# Altium footprint library My Footprint.PcbLib: 268 footprints (part 16 of 17)
Each footprint in its own frame and in the unit in brackets; x right, y up, seen from the top. Pads: shape width x height; smd on the part's side, far side on the other; paste and mask are expansions set on the pad; w line width, h text height; cw(c..) or ccw(c..) is an arc to the next point about the centre after c.
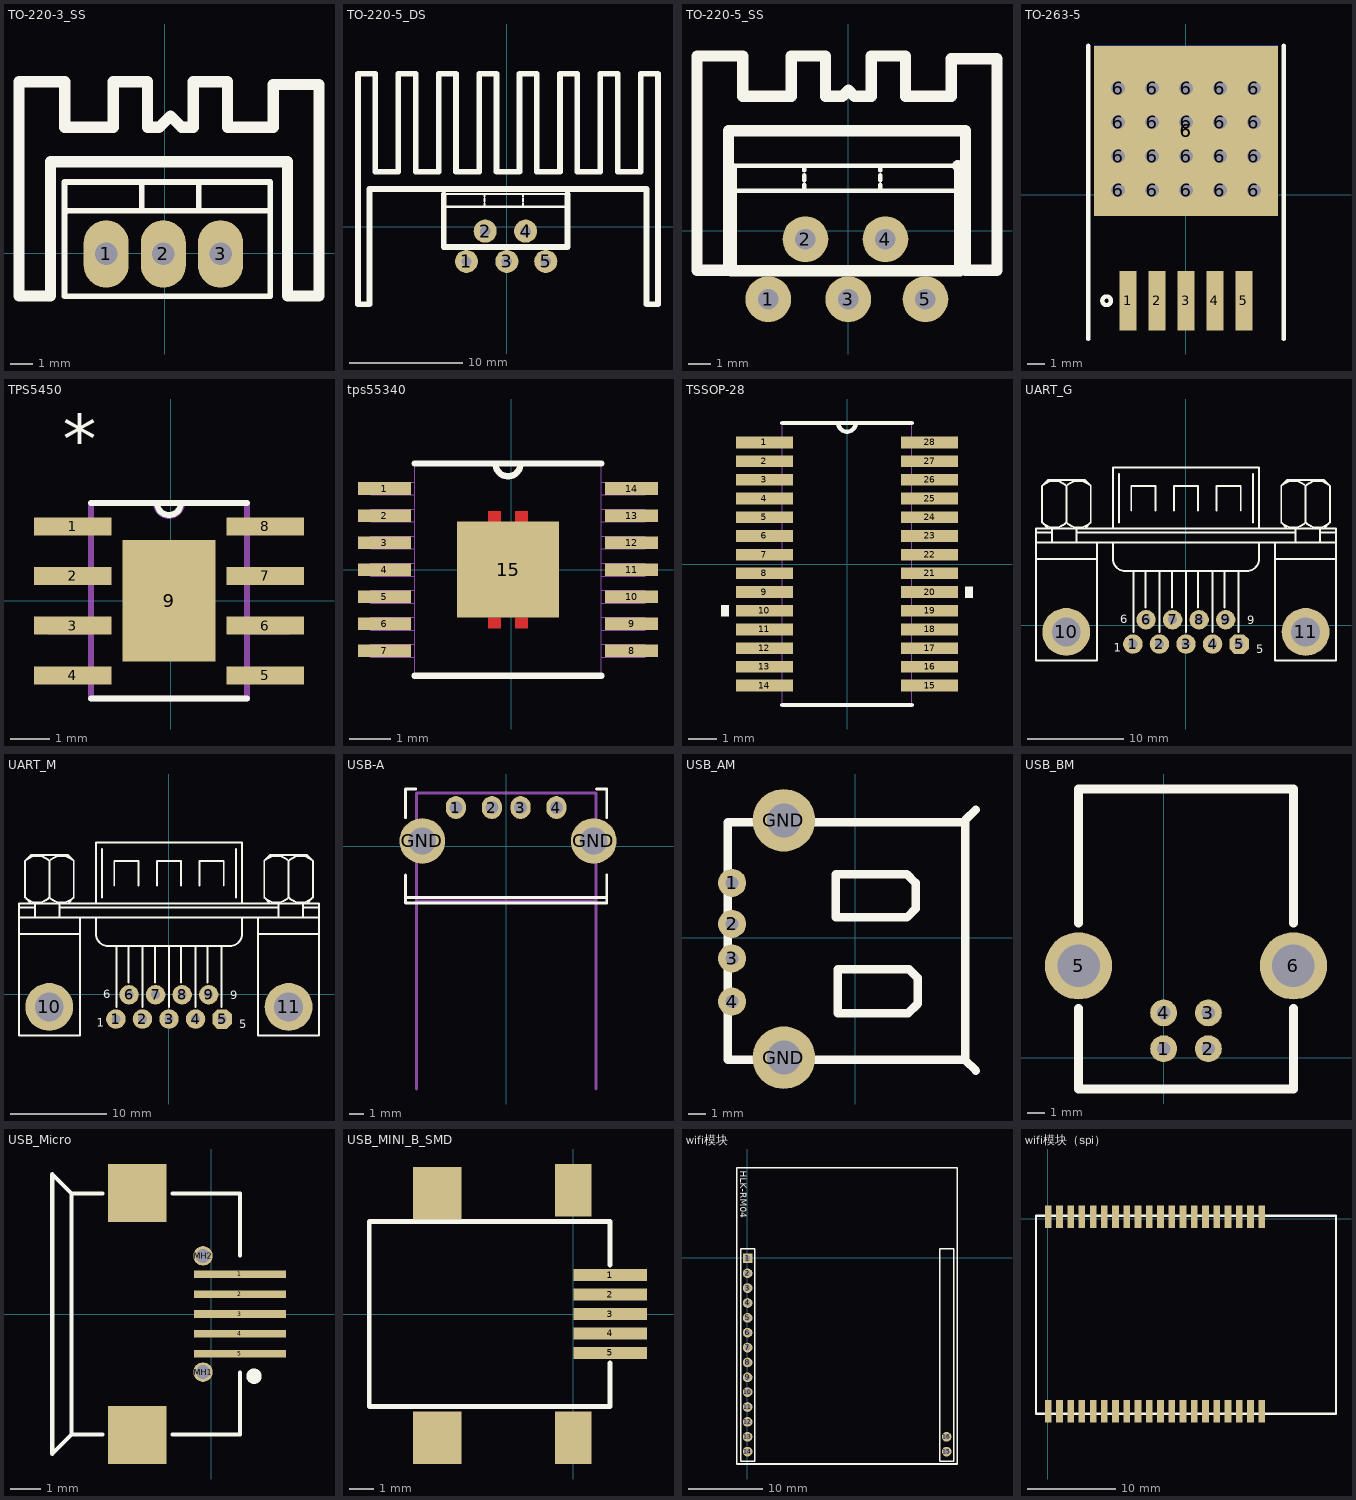
[diagram p15: the footprints below, top view; thin cyan lines are the x and y axes]

## TO-220-3_SS [mm] "小散热片的封装"
pads (3):
  oval 2x3 hole 1: 1(-2.593,-0.022) 2(-0.053,-0.022) 3(2.487,-0.022)
Top Overlay:
  lines w0.254: -4.445,1.524 -4.445,2.794 -4.445,3.175 4.699,3.175 4.699,1.651 ; -1.016,2.032 -1.016,3.175 ; 1.524,1.905 1.524,3.048 ; 4.572,1.905 -3.81,1.905 -4.318,1.905 -4.445,1.778 -4.445,-1.905 4.699,-1.905 4.699,1.905
  lines w0.5: -6.47,-1.886 -6.47,5.607 -6.47,7.639 -4.438,7.639 -4.438,5.607 -2.279,5.607 -2.279,7.639 -0.755,7.639 -0.755,5.607 -0.247,5.607 0.261,6.115 0.769,5.607 1.277,5.607 1.277,7.639 2.801,7.639 2.801,5.607 4.833,5.607 4.833,7.512 6.865,7.512 6.865,-1.886 5.468,-1.886 5.468,4.083 -5.073,4.083 -5.073,-1.886 -6.47,-1.886
3D body "三?": height 19.3, standoff -4.92, extent -5.207,-1.684 4.923,3.716

## TO-220-5_DS [mil] "大散热片的封装"
pads (5):
  round 80 hole 36: 1(-140,-120) 2(-75,-15) 3(0,-120) 4(65,-15) 5(135,-120)
Top Overlay:
  lines w7.87: -77.3,71.92 -77.3,80.25 ; -77.3,88.58 -77.3,96.92 ; -77.3,105.25 -77.3,113.58 ; 56.04,71.92 56.04,80.25 ; 56.04,88.58 56.04,96.92 ; 56.04,105.25 56.04,113.58 ; 210,70 -218.96,70 -218.96,113.58 210,113.58
  lines w19.68: -218.5,113.39 -218.5,-70 210,-70 210,70 210,113.58 ; -515.98,-268.86 -475.98,-268.86 -475.98,131.14 444.02,131.14 484.02,131.14 484.02,-268.86 524.02,-268.86 524.02,531.14 464.02,531.14 464.02,191.14 444.02,191.14 424.02,191.14 384.02,191.14 384.02,531.14 324.02,531.14 324.02,191.14 244.02,191.14 244.02,531.14 184.02,531.14 184.02,191.14 104.02,191.14 104.02,531.14 44.02,531.14 44.02,191.14 -35.98,191.14 -35.98,531.14 -95.98,531.14 -95.98,191.14 -175.98,191.14 -175.98,531.14 -235.98,531.14 -235.98,191.14 -315.98,191.14 -315.98,531.14 -335.98,531.14 -375.98,531.14 -375.98,191.14 -395.98,191.14 -455.98,191.14 -455.98,531.14 -515.98,531.14 -515.98,131.14 -515.98,-268.86
3D body "TO-220-5H.STEP": height 888.64, standoff -250.51, extent -205.08,-54 195,124

## TO-220-5_SS [mil] "小散热片的封装"
pads (5):
  round 80 hole 36: 1(-140,-120) 2(-75,-15) 3(0,-120) 4(65,-15) 5(135,-120)
Top Overlay:
  lines w7.87: -205,70 195,70 ; -205,113.58 191.42,113.58 ; -77.3,71.92 -77.3,80.25 ; -77.3,88.58 -77.3,96.92 ; -77.3,105.25 -77.3,113.58 ; 56.04,71.92 56.04,80.25 ; 56.04,88.58 56.04,96.92 ; 56.04,105.25 56.04,113.58
  lines w19.68: -205,110 -205,-70 195,-70 195,55 195,110 191.42,113.58 ; -264.72,-69.25 -209.72,-69.25 -209.72,175 205.28,175 205.28,-69.25 260.28,-69.25 260.28,300.75 180.28,300.75 180.28,235 100.28,235 100.28,305.75 40.28,305.75 40.28,235 11.02,235 0.28,245.75 -10.47,235 -39.72,235 -39.72,305.75 -99.72,305.75 -99.72,235 -184.72,235 -184.72,305.75 -264.72,305.75 -264.72,225.75 -264.72,-69.25
3D body "TO-220-5H.STEP": height 888.64, standoff -250.51, extent -195.08,-64 205,114

## TO-263-5 [mm]
height 5
pads (27):
  rect 1x3.5 smd: 1(-3.4,-6.25) 2(-1.7,-6.25) 3(0,-6.25) 4(1.7,-6.25) 5(3.4,-6.25)
  round 1.5 hole 0.8: 6(-4,0.25) 6(-4,2.25) 6(-4,4.25) 6(-4,6.25) 6(-2,0.25) 6(-2,2.25) 6(-2,4.25) 6(-2,6.25) 6(0,0.25) 6(0,2.25) 6(0,4.25) 6(0,6.25) 6(2,0.25) 6(2,2.25) 6(2,4.25) 6(2,6.25) 6(4,0.25) 6(4,2.25) 6(4,4.25) 6(4,6.25)
  rect 10.8x10 smd: 6(0,3.75)
  rect 10.8x10 smd far side: 6(0,3.75)
Top Overlay:
  circle w0.254: c-4.67,-6.25 r0.254
  lines w0.254: -5.75,-8.5 -5.75,8.75 ; 5.75,-8.5 5.75,8.75
3D body "User Library-TO-263-5.STEP": height 4.56, standoff 0, extent -5.08,-6.5 5.08,7.515

## TPS5450 [mil]
pads (9):
  rect 78x18.14 smd: 1(-99,75) 2(-99,25) 3(-99,-25) 4(-99,-75) 5(95,-75) 6(95,-25) 7(95,25) 8(95,75)
  rect 94x122 smd paste-60.5: 9(-2,0)
Top Overlay:
  lines w6: -80.5,-98.5 76.5,-98.5 ; -80.5,98.5 76.5,98.5 ; -14,98.5 ccw(c-2,98.5) 10,98.5
  text "*" at -109,138.14 h50
Top Paste:
  region: 41.06,-3.94 -45.06,-3.94 -45.06,-57.06 41.06,-57.06
  region: 41.06,57.06 -45.06,57.06 -45.06,3.94 41.06,3.94
Mechanical 1:
  lines w6: -15.08,98.5 ccw(c-2,98.5) 11.08,98.5 ; -80.5,-98.5 76.5,-98.5 76.5,98.5 -80.5,98.5 -80.5,-98.5
Mechanical 13:
  lines w0: -14,98.5 ccw(c-2,98.5) 10,98.5 ; -124,-83.07 -80.5,-83.07 -80.5,-66.93 -124,-66.93 -124,-83.07 ; -124,-33.07 -80.5,-33.07 -80.5,-16.93 -124,-16.93 -124,-33.07 ; -124,16.93 -80.5,16.93 -80.5,33.07 -124,33.07 -124,16.93 ; -124,66.93 -80.5,66.93 -80.5,83.07 -124,83.07 -124,66.93 ; -80.5,-98.5 -80.5,98.5 76.5,98.5 76.5,-98.5 -80.5,-98.5 ; 76.5,-83.07 120,-83.07 120,-66.93 76.5,-66.93 76.5,-83.07 ; 76.5,-33.07 120,-33.07 120,-16.93 76.5,-16.93 76.5,-33.07 ; 76.5,16.93 120,16.93 120,33.07 76.5,33.07 76.5,16.93 ; 76.5,66.93 120,66.93 120,83.07 76.5,83.07 76.5,66.93
  text "*" at -109,138.14 h50
3D body "DDA0008A.stp": height 60, standoff -1, extent -119.24,-96.5 115.26,96.5

## tps55340 [mil]
pads (15):
  rect 50x12 smd: 1(-120,76.77) 2(-120,51.18) 3(-120,25.59) 4(-120,0) 5(-120,-25.59) 6(-120,-51.18) 7(-120,-76.77) 8(114,-76.77) 9(114,-51.18) 10(114,-25.59) 11(114,0) 12(114,25.59) 13(114,51.18) 14(114,76.77)
  rect 96.85x90.94 smd: 15(-3,0)
Top Layer:
  region: -3,45.47
  region: -3,-45.47
  region: 15.7,45.47 3.89,45.47 3.89,55.31 15.7,55.31
  region: -21.7,45.47 -9.89,45.47 -9.89,55.31 -21.7,55.31
  region: -21.7,-45.47 -9.89,-45.47 -9.89,-55.31 -21.7,-55.31
  region: 15.7,-45.47 3.89,-45.47 3.89,-55.31 15.7,-55.31
Top Overlay:
  lines w6: -91.5,-100.5 85.5,-100.5 ; -91.5,100.5 85.5,100.5 ; -15,100.5 ccw(c-3,100.5) 9,100.5
Top Solder:
  region: -3,45.47
  region: -3,-45.47
  region: 15.7,45.47 3.89,45.47 3.89,55.31 15.7,55.31
  region: -21.7,45.47 -9.89,45.47 -9.89,55.31 -21.7,55.31
  region: -21.7,-45.47 -9.89,-45.47 -9.89,-55.31 -21.7,-55.31
  region: 15.7,-45.47 3.89,-45.47 3.89,-55.31 15.7,-55.31
Mechanical 1:
  lines w0: -15,100.5 ccw(c-3,100.5) 9,100.5 ; -133,-82.77 -133,-70.77 -91.5,-70.77 -91.5,-82.77 -133,-82.77 ; -133,-57.18 -133,-45.18 -91.5,-45.18 -91.5,-57.18 -133,-57.18 ; -133,-31.59 -133,-19.59 -91.5,-19.59 -91.5,-31.59 -133,-31.59 ; -133,-6 -133,6 -91.5,6 -91.5,-6 -133,-6 ; -133,19.59 -133,31.59 -91.5,31.59 -91.5,19.59 -133,19.59 ; -133,45.18 -133,57.18 -91.5,57.18 -91.5,45.18 -133,45.18 ; -133,70.77 -133,82.77 -91.5,82.77 -91.5,70.77 -133,70.77 ; -91.5,-100.5 85.5,-100.5 85.5,100.5 -91.5,100.5 -91.5,-100.5 ; 85.5,-82.77 85.5,-70.77 127,-70.77 127,-82.77 85.5,-82.77 ; 85.5,-57.18 85.5,-45.18 127,-45.18 127,-57.18 85.5,-57.18 ; 85.5,-31.59 85.5,-19.59 127,-19.59 127,-31.59 85.5,-31.59 ; 85.5,-6 85.5,6 127,6 127,-6 85.5,-6 ; 85.5,19.59 85.5,31.59 127,31.59 127,19.59 85.5,19.59 ; 85.5,45.18 85.5,57.18 127,57.18 127,45.18 85.5,45.18 ; 85.5,70.77 85.5,82.77 127,82.77 127,70.77 85.5,70.77
3D body "PWP0014A.stp": height 38.22, standoff -1.15, extent -129.34,-98.42 123.33,98.43

## TSSOP-28 [mil]
pads (28):
  rect 78x16 smd: 1(-113,166.34) 2(-113,140.75) 3(-113,115.16) 4(-113,89.57) 5(-113,63.98) 6(-113,38.39) 7(-113,12.8) 8(-113,-12.8) 9(-113,-38.39) 10(-113,-63.98) 11(-113,-89.57) 12(-113,-115.16) 13(-113,-140.75) 14(-113,-166.34) 15(113,-166.34) 16(113,-140.75) 17(113,-115.16) 18(113,-89.57) 19(113,-63.98) 20(113,-38.39) 21(113,-12.8) 22(113,12.8) 23(113,38.39) 24(113,63.98) 25(113,89.57) 26(113,115.16) 27(113,140.75) 28(113,166.34)
Top Overlay:
  region: 162,-30.89 172,-30.89 172,-45.89 162,-45.89
  region: -162,-56.48 -172,-56.48 -172,-71.48 -162,-71.48
  lines w6: -88.5,-193 88.5,-193 ; -88.5,193 88.5,193 ; -12,193 ccw(c0,193) 12,193
Mechanical 1:
  lines w0: -12,193 ccw(c0,193) 12,193 ; -130,-172.34 -88.5,-172.34 -88.5,-160.34 -130,-160.34 -130,-172.34 ; -130,-146.75 -88.5,-146.75 -88.5,-134.75 -130,-134.75 -130,-146.75 ; -130,-121.16 -88.5,-121.16 -88.5,-109.16 -130,-109.16 -130,-121.16 ; -130,-95.57 -88.5,-95.57 -88.5,-83.57 -130,-83.57 -130,-95.57 ; -130,-69.98 -88.5,-69.98 -88.5,-57.98 -130,-57.98 -130,-69.98 ; -130,-44.39 -88.5,-44.39 -88.5,-32.39 -130,-32.39 -130,-44.39 ; -130,-18.8 -88.5,-18.8 -88.5,-6.8 -130,-6.8 -130,-18.8 ; -130,6.8 -88.5,6.8 -88.5,18.8 -130,18.8 -130,6.8 ; -130,32.39 -88.5,32.39 -88.5,44.39 -130,44.39 -130,32.39 ; -130,57.98 -88.5,57.98 -88.5,69.98 -130,69.98 -130,57.98 ; -130,83.57 -88.5,83.57 -88.5,95.57 -130,95.57 -130,83.57 ; -130,109.16 -88.5,109.16 -88.5,121.16 -130,121.16 -130,109.16 ; -130,134.75 -88.5,134.75 -88.5,146.75 -130,146.75 -130,134.75 ; -130,160.34 -88.5,160.34 -88.5,172.34 -130,172.34 -130,160.34 ; -88.5,-193 -88.5,193 88.5,193 88.5,-193 -88.5,-193 ; 88.5,-172.34 130,-172.34 130,-160.34 88.5,-160.34 88.5,-172.34 ; 88.5,-146.75 130,-146.75 130,-134.75 88.5,-134.75 88.5,-146.75 ; 88.5,-121.16 130,-121.16 130,-109.16 88.5,-109.16 88.5,-121.16 ; 88.5,-95.57 130,-95.57 130,-83.57 88.5,-83.57 88.5,-95.57 ; 88.5,-69.98 130,-69.98 130,-57.98 88.5,-57.98 88.5,-69.98 ; 88.5,-44.39 130,-44.39 130,-32.39 88.5,-32.39 88.5,-44.39 ; 88.5,-18.8 130,-18.8 130,-6.8 88.5,-6.8 88.5,-18.8 ; 88.5,6.8 130,6.8 130,18.8 88.5,18.8 88.5,6.8 ; 88.5,32.39 130,32.39 130,44.39 88.5,44.39 88.5,32.39 ; 88.5,57.98 130,57.98 130,69.98 88.5,69.98 88.5,57.98 ; 88.5,83.57 130,83.57 130,95.57 88.5,95.57 88.5,83.57 ; 88.5,109.16 130,109.16 130,121.16 88.5,121.16 88.5,109.16 ; 88.5,134.75 130,134.75 130,146.75 88.5,146.75 88.5,134.75 ; 88.5,160.34 130,160.34 130,172.34 88.5,172.34 88.5,160.34
3D body "PW TSSOP28A.stp": height 14.86, standoff -24.51, extent -121.39,-190.94 131.38,190.95

## UART_G [mil]
pads (11):
  round 80 hole 37: 1(-217.41,-76.65) 2(-108.25,-76.65) 3(0.92,-76.65) 4(110.08,-76.65) 6(-163.25,23.35) 7(-54.08,23.35) 8(55.08,23.35) 9(164.25,23.35)
  oct 80x80 hole 37: 5(219.25,-76.65)
  round 196.67 hole 118.33: 10(-491.58,-26.65) 11(492.58,-26.65)
Top Overlay:
  lines w8: -615.75,273.35 -365.75,273.35 ; -615.75,340.01 617.58,340.01 ; -615.75,381.68 -549.08,381.68 ; -590.83,423.26 ccw(c-540.75,473.35) -490.66,423.26 ; -590.83,573.43 cw(c-540.75,523.35) -490.66,573.43 ; -565.75,398.35 -590.75,423.35 -590.75,573.35 -565.75,598.35 -415.75,598.35 -390.75,573.35 -390.75,423.35 -415.75,398.35 ; -549.08,340.01 -549.08,398.35 ; -490.83,423.26 ccw(c-440.75,473.35) -390.66,423.26 ; -490.83,573.43 cw(c-440.75,523.35) -390.66,573.43 ; -490.75,423.35 -490.75,573.35 ; -449.08,340.01 -449.08,398.35 ; -449.08,381.68 450.92,381.68 ; -365.75,340.01 -365.75,-143.32 -615.75,-143.32 -615.75,398.35 617.58,398.35 617.58,-143.32 367.58,-143.32 367.58,340.01 ; -299.08,340.01 -299.08,273.35 ccw(c-249.08,273.35) -249.08,223.35 250.92,223.35 ccw(c250.92,273.35) 300.92,273.35 300.92,340.01 ; -299.08,398.35 -299.08,648.35 300.92,648.35 300.92,398.35 ; -274.08,423.35 -274.08,623.35 ; -224.08,473.35 -224.08,573.35 -124.08,573.35 -124.08,473.35 ; -215.75,-26.65 -215.75,223.35 ; -165.75,73.35 -165.75,223.35 ; -107.41,-26.65 -107.41,223.35 ; -57.41,73.35 -57.41,223.35 ; -49.08,473.35 -49.08,573.35 50.92,573.35 50.92,473.35 ; 0.92,-26.65 0.92,223.35 ; 50.92,73.35 50.92,223.35 ; 109.25,-26.65 109.25,223.35 ; 125.92,473.35 125.92,573.35 225.92,573.35 225.92,473.35 ; 159.25,73.35 159.25,223.35 ; 217.58,-26.65 217.58,223.35 ; 275.92,423.35 275.92,623.35 ; 367.58,273.35 617.58,273.35 ; 392.5,423.26 ccw(c442.58,473.35) 492.67,423.26 ; 392.5,573.43 cw(c442.58,523.35) 492.67,573.43 ; 417.58,398.35 392.58,423.35 392.58,573.35 417.58,598.35 567.58,598.35 592.58,573.35 592.58,423.35 567.58,398.35 ; 450.92,340.01 450.92,398.35 ; 492.5,423.26 ccw(c542.58,473.35) 592.67,423.26 ; 492.5,573.43 cw(c542.58,523.35) 592.67,573.43 ; 492.58,423.35 492.58,573.35 ; 550.92,340.01 550.92,398.35 ; 550.92,381.68 617.58,381.68
  text "9" at 252.72,4.84 h35
  text "5" at 290.12,-114.84 h35
  text "6" at -269.33,7.99 h35
  text "1" at -295.31,-108.94 h35
3D body "DR9-PIN_DSUB.STEP": height 493.04, standoff -125.96, extent -606,-162.5 610,612.5

## UART_M [mil]
pads (11):
  round 80 hole 37: 1(-217.41,-101.65) 2(-108.25,-101.65) 3(0.92,-101.65) 4(110.08,-101.65) 6(-163.25,-1.65) 7(-54.08,-1.65) 8(55.08,-1.65) 9(164.25,-1.65)
  oct 80x80 hole 37: 5(219.25,-101.65)
  round 196.67 hole 118.33: 10(-491.58,-51.65) 11(492.58,-51.65)
Top Overlay:
  lines w8: -615.75,248.35 -365.75,248.35 ; -615.75,315.01 617.58,315.01 ; -615.75,356.68 -549.08,356.68 ; -590.83,398.26 ccw(c-540.75,448.35) -490.66,398.26 ; -590.83,548.43 cw(c-540.75,498.35) -490.66,548.43 ; -565.75,373.35 -590.75,398.35 -590.75,548.35 -565.75,573.35 -415.75,573.35 -390.75,548.35 -390.75,398.35 -415.75,373.35 ; -549.08,315.01 -549.08,373.35 ; -490.83,398.26 ccw(c-440.75,448.35) -390.66,398.26 ; -490.83,548.43 cw(c-440.75,498.35) -390.66,548.43 ; -490.75,398.35 -490.75,548.35 ; -449.08,315.01 -449.08,373.35 ; -449.08,356.68 450.92,356.68 ; -365.75,315.01 -365.75,-168.32 -615.75,-168.32 -615.75,373.35 617.58,373.35 617.58,-168.32 367.58,-168.32 367.58,315.01 ; -299.08,315.01 -299.08,248.35 ccw(c-249.08,248.35) -249.08,198.35 250.92,198.35 ccw(c250.92,248.35) 300.92,248.35 300.92,315.01 ; -299.08,373.35 -299.08,623.35 300.92,623.35 300.92,373.35 ; -274.08,398.35 -274.08,598.35 ; -224.08,448.35 -224.08,548.35 -124.08,548.35 -124.08,448.35 ; -215.75,-51.65 -215.75,198.35 ; -165.75,48.35 -165.75,198.35 ; -107.41,-51.65 -107.41,198.35 ; -57.41,48.35 -57.41,198.35 ; -49.08,448.35 -49.08,548.35 50.92,548.35 50.92,448.35 ; 0.92,-51.65 0.92,198.35 ; 50.92,48.35 50.92,198.35 ; 109.25,-51.65 109.25,198.35 ; 125.92,448.35 125.92,548.35 225.92,548.35 225.92,448.35 ; 159.25,48.35 159.25,198.35 ; 217.58,-51.65 217.58,198.35 ; 275.92,398.35 275.92,598.35 ; 367.58,248.35 617.58,248.35 ; 392.5,398.26 ccw(c442.58,448.35) 492.67,398.26 ; 392.5,548.43 cw(c442.58,498.35) 492.67,548.43 ; 417.58,373.35 392.58,398.35 392.58,548.35 417.58,573.35 567.58,573.35 592.58,548.35 592.58,398.35 567.58,373.35 ; 450.92,315.01 450.92,373.35 ; 492.5,398.26 ccw(c542.58,448.35) 592.67,398.26 ; 492.5,548.43 cw(c542.58,498.35) 592.67,548.43 ; 492.58,398.35 492.58,548.35 ; 550.92,315.01 550.92,373.35 ; 550.92,356.68 617.58,356.68
  text "1" at -295.31,-133.94 h35
  text "6" at -269.33,-17.01 h35
  text "5" at 290.12,-139.84 h35
  text "9" at 252.72,-20.16 h35
3D body "DR9-PIN_DSUB-1.STEP": height 107.06, standoff -511.94, extent -603,-180.5 610,570.5

## USB-A [mm]
pads (6):
  oval 1.4x1.6 hole 0.9: 1(-3.5,2.71) 2(-1,2.71) 3(1,2.71) 4(3.5,2.71)
  round 3.175 hole 1.905: GND(-5.842,0.381) GND(6.096,0.381)
Top Overlay:
  lines w0.2: -7.015,-3.556 6.985,-3.556 ; -7,-2 -7,-3.937 6.985,-3.937 ; -7,2 -7,4 -6.3,4 ; 6.3,4 7,4 7,2 ; 7,-3.937 7,-2
Mechanical 1:
  lines w0.2: -6.25,-16.891 -6.25,3.71 6.25,3.71 6.25,-16.891 ; -6.25,-3.88 6.25,-3.88 ; -6.25,-3.81 6.25,-3.81
3D body "USB-AM-S-F-B-TH.step": height 0.67, standoff -5.03, extent -6.25,-17.097 6.25,2.933

## USB_AM [mil]
pads (6):
  round 65 hole 30: 1(-285.63,127.09) 2(-285.63,32.09) 3(-285.63,-47.91) 4(-285.63,-147.91)
  round 145 hole 78.74: GND(-165.63,-277.91) GND(-165.63,272.09)
Top Overlay:
  lines w19.68: -295.63,-282.91 -295.63,267.09 254.37,267.09 ; -290.63,-282.91 254.37,-282.91 ; -45.63,47.09 -45.63,147.09 119.37,147.09 139.37,127.09 139.37,122.09 ; -40.63,47.09 119.37,47.09 139.37,67.09 139.37,117.09 ; 144.37,-102.91 144.37,-152.91 122.28,-175 -40.63,-175 -40.63,-72.91 124.37,-72.91 144.37,-92.91 144.37,-97.91 ; 279.37,-307.91 254.37,-282.91 ; 279.37,297.09 254.37,272.09 254.37,267.09 ; 254.37,-282.91 254.37,267.09
3D body "USB-A-S-F-B-TH.step": height 300, standoff -130.07, extent -322.56,-321.02 232.56,300.99

## USB_BM [mil]
pads (6):
  round 60 hole 30: 1(0,20) 2(100,20) 3(100,100) 4(0,100)
  round 150 hole 95: 5(-190,205) 6(290,205)
Top Overlay:
  lines w19.68: -190,110 -190,-70 0,-70 290,-70 290,110 ; -190,300 -190,600 290,600 290,300
3D body "USB-B DIP.STEP": height 450, standoff -126.49, extent -241.22,-39.29 341.32,610.31

## USB_Micro [mm]
pads (9):
  rect 3x0.25 smd: 1(0.936,1.3) 2(0.936,0.65) 3(0.936,0) 4(0.936,-0.65) 5(0.936,-1.3)
  round 0.635 hole 0.457 unplated: MH1(-0.272,-1.9) MH2(-0.272,1.9)
  rect 1.9x1.9 smd: ""(-2.422,-3.95) ""(-2.422,3.95)
Top Overlay:
  circle w0.25: c1.395,-2.032 r0.125
  lines w0.127: -5.202,-4.567 -4.572,-3.937 -3.556,-3.937 ; -5.202,4.567 -4.572,3.937 -3.556,3.937 ; -4.572,-3.9 -4.572,3.9 ; -1.27,-3.937 0.936,-3.937 ; -1.27,3.937 0.936,3.937 ; 0.936,-3.9 0.936,-1.905 ; 0.936,1.905 0.936,3.9
  lines w0.145: -5.202,-4.567 -5.202,4.567

## USB_MINI_B_SMD [mm]
pads (9):
  rect 3x0.5 smd: 1(1.516,1.6) 2(1.516,0.8) 3(1.516,0) 4(1.516,-0.8) 5(1.516,-1.6)
  rect 2x2.159 smd: ""(-5.588,-5.08) ""(-5.588,4.953)
  rect 1.5x2.159 smd: ""(0,-5.08) ""(0,5.08)
Top Overlay:
  lines w0.2: 1.5,-2 1.5,-3.8 -8.382,-3.8 -8.382,3.8 1.5,3.8 1.5,2
3D body "USB_mini_B.STEP": height 3.95, standoff -1, extent -8.311,-5.35 0.889,5.35

## wifi模块 [mm]
pads (16):
  rect 1.3x1.3 hole 0.8: 1(0.076,-0.102)
  round 1.3 hole 0.8: 2(0.076,-2.102) 3(0.076,-4.102) 4(0.076,-6.102) 5(0.076,-8.102) 6(0.076,-10.102) 7(0.076,-12.102) 8(0.076,-14.102) 9(0.076,-16.102) 10(0.076,-18.102) 11(0.076,-20.102) 12(0.076,-22.102) 13(0.076,-24.102) 14(0.076,-26.102) 15(26.857,-26.102) 16(26.857,-24.102)
Top Overlay:
  lines w0.2: -0.87,-27.402 -0.87,1.168 1.03,1.168 1.03,-27.402 -0.87,-27.402 ; 25.911,-27.402 25.911,1.168 27.811,1.168 27.811,-27.402 25.911,-27.402
  lines w0.203: -1.41,-27.766 -1.41,12.112 28.308,12.112 28.308,-27.766 -1.41,-27.766
  text "HLK-RM04" at -0.94,11.709 h0.89

## wifi模块（spi） [mil]
pads (40):
  rect 29.92x100 smd: 1(952,11) 2(902,11) 3(852,11) 4(802,11) 5(752,11) 6(702,11) 7(652,11) 8(602,11) 9(552,11) 10(502,11) 11(452,11) 12(402,11) 13(352,11) 14(302,11) 15(252,11) 16(202,11) 17(152,11) 18(102,11) 19(52,11) 20(2,11) 21(2,-856) 22(52,-856) 23(102,-856) 24(152,-856) 25(202,-856) 26(252,-856) 27(302,-856) 28(352,-856) 29(402,-856) 30(452,-856) 31(502,-856) 32(552,-856) 33(602,-856) 34(652,-856) 35(702,-856) 36(752,-856) 37(802,-856) 38(852,-856) 39(902,-856) 40(952,-856)
Top Overlay:
  lines w10: -52,-866 1282,-866 1282,14 -52,14 -52,-866